# Altium footprint library Printing.PcbLib: 48 footprints (part 2 of 3)
Each footprint in its own frame and in the unit in brackets; x right, y up, seen from the top. Pads: shape width x height; smd on the part's side, far side on the other; paste and mask are expansions set on the pad; w line width, h text height; cw(c..) or ccw(c..) is an arc to the next point about the centre after c.
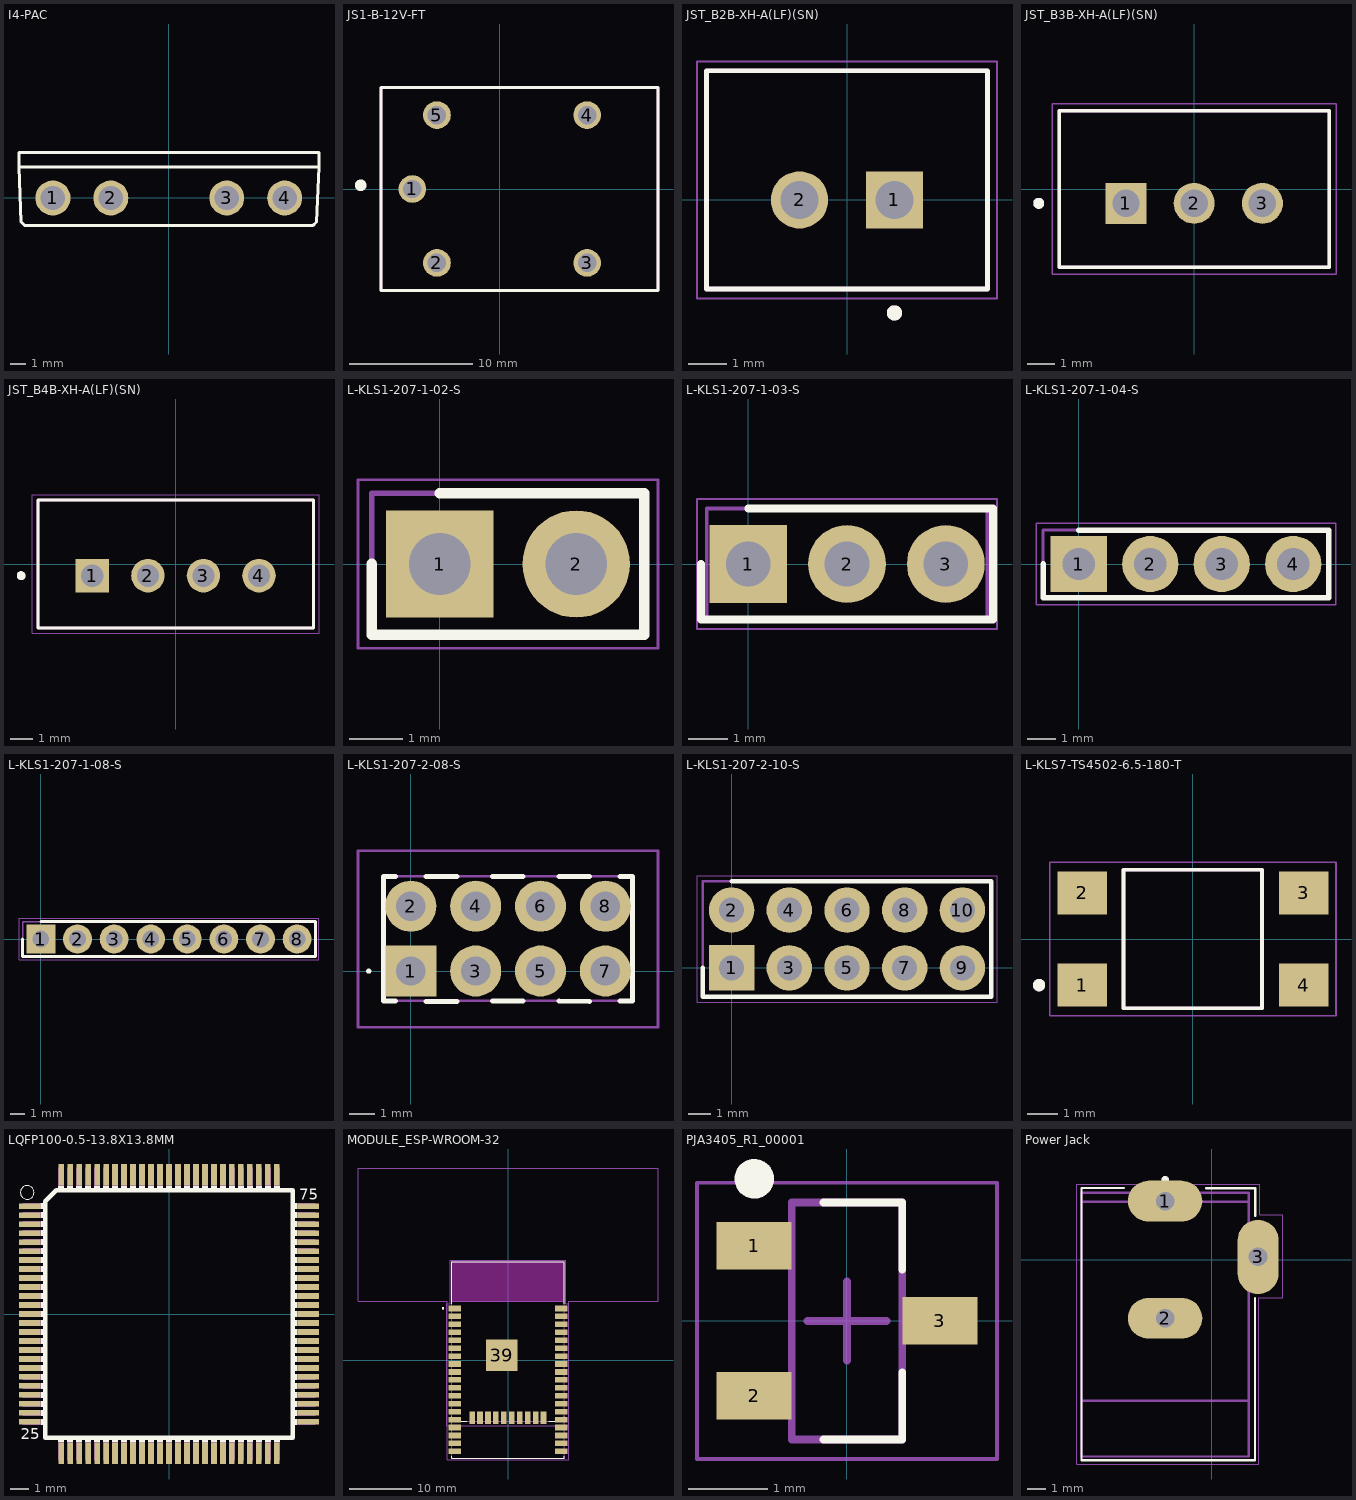
[diagram p1: the footprints below, top view; thin cyan lines are the x and y axes]

## I4-PAC [mm]
pads (4):
  round 2.3 hole 1.6: 1(-7.62,0) 2(-3.81,0) 3(3.81,0) 4(7.62,0)
Top Overlay:
  lines w0.203: -9.85,2.025 -9.71,-1.58 -9.456,-1.825 9.457,-1.825 9.711,-1.583 9.875,2.025 ; -9.85,2.025 -9.85,3 9.875,3 9.875,2.025 ; -9.85,2.025 9.875,2.025

## JS1-B-12V-FT [mm]
pads (5):
  round 2.25 hole 1.5: 1(-7.1,0) 2(-5.1,-6) 3(7.1,-6) 4(7.1,6) 5(-5.1,6)
Top Overlay:
  circle w0.5: c-11.293,0.301 r0.219
  lines w0.254: -9.65,-8.25 -9.65,8.25 12.85,8.25 12.85,-8.25 -9.65,-8.25
Mechanical 13:
  lines w0.254: -9.65,-8.25 12.85,-8.25 12.85,8.25 -9.65,8.25 -9.65,-8.25
3D body "G5LE-1-DC5.stp": height 18.5, standoff -4, extent -9.65,-8.25 12.85,8.25

## JST_B2B-XH-A(LF)(SN) [mm]
pads (2):
  rect 1.508x1.508 hole 1: 1(1.25,0)
  round 1.508 hole 1: 2(-1.25,0)
Top Overlay:
  circle w0.2: c1.25,-2.975 r0.1
  lines w0.127: -3.7,-2.35 -3.7,3.4 3.7,3.4 3.7,-2.35 -3.7,-2.35
Mechanical 13:
  circle w0.2: c1.25,-2.975 r0.1
  lines w0.127: -3.7,-2.35 -3.7,3.4 3.7,3.4 3.7,-2.35 -3.7,-2.35
Mechanical 15:
  lines w0.05: -3.95,-2.6 -3.95,3.65 3.95,3.65 3.95,-2.6 -3.95,-2.6
3D body "step_temp.STEP": height 7, standoff -3.4, extent -3.7,-2.321 3.7,3.429

## JST_B3B-XH-A(LF)(SN) [mm]
pads (3):
  rect 1.508x1.508 hole 1: 1(-2.5,-0.525)
  round 1.508 hole 1: 2(0,-0.525) 3(2.5,-0.525)
Top Overlay:
  circle w0.2: c-5.7,-0.525 r0.1
  lines w0.127: -4.95,-2.875 4.95,-2.875 4.95,2.875 -4.95,2.875 -4.95,-2.875
Mechanical 13:
  circle w0.2: c-5.7,-0.525 r0.1
  lines w0.127: -4.95,-2.875 4.95,-2.875 4.95,2.875 -4.95,2.875 -4.95,-2.875
Mechanical 15:
  lines w0.05: -5.2,-3.125 -5.2,3.125 5.2,3.125 5.2,-3.125 -5.2,-3.125
3D body "B3B-XH-A-LF--SN---3DModel-STEP-418109.STEP": height 7, standoff -3.4, extent -4.95,-2.875 4.95,2.875

## JST_B4B-XH-A(LF)(SN) [mm]
pads (4):
  rect 1.508x1.508 hole 1: 1(-3.75,-0.525)
  round 1.508 hole 1: 2(-1.25,-0.525) 3(1.25,-0.525) 4(3.75,-0.525)
Top Overlay:
  circle w0.2: c-6.95,-0.525 r0.1
  lines w0.127: -6.2,-2.875 -6.2,2.875 6.2,2.875 6.2,-2.875 -6.2,-2.875
Mechanical 13:
  circle w0.2: c-6.95,-0.525 r0.1
  lines w0.127: -6.2,-2.875 -6.2,2.875 6.2,2.875 6.2,-2.875 -6.2,-2.875
Mechanical 15:
  lines w0.05: -6.45,-3.125 6.45,-3.125 6.45,3.125 -6.45,3.125 -6.45,-3.125
3D body "B4B-XH-A-LF--SN---3DModel-STEP-418109.STEP": height 7, standoff -3.4, extent -6.2,-2.875 6.2,2.875

## L-KLS1-207-1-02-S [mm]
pads (2):
  rect 2x2 hole 1.15: 1(0,0)
  round 2 hole 1.15: 2(2.54,0)
Top Overlay:
  lines w0.2: -1.27,0 -1.27,-1.32 3.81,-1.32 3.81,1.32 0,1.32
Mechanical 13:
  lines w0.1: -1.27,-1.32 3.81,-1.32 3.81,1.32 -1.27,1.32 -1.27,-1.32
Mechanical 15:
  lines w0.05: -1.524,-1.57 4.064,-1.57 4.064,1.57 -1.524,1.57 -1.524,-1.57
3D body "M20-9990246.stp": height 8.74, standoff -3, extent -1.27,-1.27 3.81,1.27

## L-KLS1-207-1-03-S [mm]
pads (3):
  rect 2x2 hole 1.15: 1(0,0)
  round 2 hole 1.15: 2(2.54,0) 3(5.08,0)
Top Overlay:
  lines w0.2: -1.212,0 -1.212,-1.425 6.293,-1.425 6.293,1.425 0,1.425
Mechanical 13:
  lines w0.1: -1.065,-1.425 -1.065,1.425 6.145,1.425 6.145,-1.425 -1.065,-1.425
Mechanical 15:
  lines w0.05: -1.315,-1.675 -1.315,1.675 6.395,1.675 6.395,-1.675 -1.315,-1.675
3D body "5-146281-3.stp": height 8.12, standoff -3.05, extent -1.067,-1.168 6.147,1.168

## L-KLS1-207-1-04-S [mm]
pads (4):
  rect 2x2 hole 1.15: 1(0,0)
  round 2 hole 1.15: 2(2.54,0) 3(5.08,0) 4(7.62,0)
Top Overlay:
  lines w0.2: -1.27,0 -1.27,-1.205 8.89,-1.205 8.89,1.205 0,1.205
Mechanical 13:
  lines w0.1: -1.27,-1.205 -1.27,1.205 8.89,1.205 8.89,-1.205 -1.27,-1.205
Mechanical 15:
  lines w0.05: -1.524,-1.455 -1.524,1.455 9.144,1.455 9.144,-1.455 -1.524,-1.455
3D body "68001-204HLF.stp": height 8.18, standoff -3.25, extent -1.27,-1.206 8.89,1.206

## L-KLS1-207-1-08-S [mm]
pads (8):
  rect 2x2 hole 1.15: 1(0,0)
  round 2 hole 1.15: 2(2.54,0) 3(5.08,0) 4(7.62,0) 5(10.16,0) 6(12.7,0) 7(15.24,0) 8(17.78,0)
Top Overlay:
  lines w0.2: -1.27,0 -1.27,-1.205 19.05,-1.205 19.05,1.205 0,1.205
Mechanical 13:
  lines w0.1: -1.27,-1.205 -1.27,1.205 19.05,1.205 19.05,-1.205 -1.27,-1.205
Mechanical 15:
  lines w0.05: -1.52,-1.455 -1.52,1.455 19.3,1.455 19.3,-1.455 -1.52,-1.455
3D body "68001-208HLF.stp": height 8.38, standoff -3.05, extent -1.27,-1.206 19.05,1.206

## L-KLS1-207-2-08-S [mm]
pads (8):
  rect 2x2 hole 1.15: 1(0,0)
  round 2 hole 1.15: 2(0,2.54) 3(2.54,0) 4(2.54,2.54) 5(5.08,0) 6(5.08,2.54) 7(7.62,0) 8(7.62,2.54)
Top Overlay:
  lines w0.1: -1.7,0 cw(c-1.65,0) -1.6,0 cw(c-1.65,0) -1.7,0
  lines w0.2: -0.6,-1.17 -1.07,-1.17 -1.07,3.71 -0.6,3.71 ; 0.6,-1.2 1.8,-1.2 ; 0.6,3.71 1.8,3.71 ; 3.2,-1.17 4.4,-1.17 ; 3.2,3.71 4.4,3.71 ; 5.8,-1.17 7,-1.2 ; 5.8,3.71 7,3.71 ; 8.2,-1.17 8.68,-1.17 8.68,3.71 8.2,3.71
Mechanical 13:
  lines w0.1: -1.07,-1.17 8.68,-1.17 8.68,3.71 -1.07,3.71 -1.07,-1.17
Mechanical 15:
  lines w0.1: -2.07,-2.2 9.68,-2.2 9.68,4.71 -2.07,4.71 -2.07,-2.2
3D body "5-146254-4.stp": height 8.2, standoff -2.97, extent -1.067,-1.178 8.687,3.698

## L-KLS1-207-2-10-S [mm]
pads (10):
  rect 2x2 hole 1.1: 1(0,0)
  round 2 hole 1.1: 2(0,2.54) 3(2.54,0) 4(2.54,2.54) 5(5.08,0) 6(5.08,2.54) 7(7.62,0) 8(7.62,2.54) 9(10.16,0) 10(10.16,2.54)
Top Overlay:
  lines w0.2: -1.27,0 -1.27,-1.27 11.43,-1.27 11.43,3.81 0,3.81
Mechanical 13:
  lines w0.1: -1.27,-1.27 11.43,-1.27 11.43,3.81 -1.27,3.81 -1.27,-1.27
Mechanical 15:
  lines w0.05: -1.52,-1.52 11.68,-1.52 11.68,4.06 -1.52,4.06 -1.52,-1.52
3D body "90131-0765.stp": height 9.25, standoff -2.9, extent -1.27,-1.27 11.43,3.81

## L-KLS7-TS4502-6.5-180-T [mm]
pads (4):
  rect 1.6x1.4 smd: 1(-3.6,-1.5) 2(-3.6,1.5) 3(3.6,1.5) 4(3.6,-1.5)
Top Overlay:
  circle w0.2: c-5,-1.5 r0.1
  lines w0.127: -2.25,-2.25 -2.25,2.25 2.25,2.25 2.25,-2.25 -2.25,-2.25
Mechanical 13:
  circle w0.2: c-5,-1.5 r0.1
  lines w0.127: -2.25,-2.25 -2.25,2.25 2.25,2.25 2.25,-2.25 -2.25,-2.25
Mechanical 15:
  lines w0.05: -4.65,-2.5 -4.65,2.5 4.65,2.5 4.65,-2.5 -4.65,-2.5
3D body "step_temp.STEP": height 3.7, standoff -0.1, extent -3.75,-2.25 3.75,2.25

## LQFP100-0.5-13.8X13.8MM [mm]
pads (100):
  rect 1.2x0.32 smd: 1(-7.75,6) 2(-7.75,5.5) 3(-7.75,5) 4(-7.75,4.5) 5(-7.75,4) 6(-7.75,3.5) 7(-7.75,3) 8(-7.75,2.5) 9(-7.75,2) 10(-7.75,1.5) 11(-7.75,1) 12(-7.75,0.5) 13(-7.75,0) 14(-7.75,-0.5) 15(-7.75,-1) 16(-7.75,-1.5) 17(-7.75,-2) 18(-7.75,-2.5) 19(-7.75,-3) 20(-7.75,-3.5) 21(-7.75,-4) 22(-7.75,-4.5) 23(-7.75,-5) 24(-7.75,-5.5) 25(-7.75,-6) 51(7.75,-6) 52(7.75,-5.5) 53(7.75,-5) 54(7.75,-4.5) 55(7.75,-4) 56(7.75,-3.5) 57(7.75,-3) 58(7.75,-2.5) 59(7.75,-2) 60(7.75,-1.5) 61(7.75,-1) 62(7.75,-0.5) 63(7.75,0) 64(7.75,0.5) 65(7.75,1) 66(7.75,1.5) 67(7.75,2) 68(7.75,2.5) 69(7.75,3) 70(7.75,3.5) 71(7.75,4) 72(7.75,4.5) 73(7.75,5) 74(7.75,5.5) 75(7.75,6)
  rect 0.32x1.2 smd: 26(-6,-7.75) 27(-5.5,-7.75) 28(-5,-7.75) 29(-4.5,-7.75) 30(-4,-7.75) 31(-3.5,-7.75) 32(-3,-7.75) 33(-2.5,-7.75) 34(-2,-7.75) 35(-1.5,-7.75) 36(-1,-7.75) 37(-0.5,-7.75) 38(0,-7.75) 39(0.5,-7.75) 40(1,-7.75) 41(1.5,-7.75) 42(2,-7.75) 43(2.5,-7.75) 44(3,-7.75) 45(3.5,-7.75) 46(4,-7.75) 47(4.5,-7.75) 48(5,-7.75) 49(5.5,-7.75) 50(6,-7.75) 76(6,7.75) 77(5.5,7.75) 78(5,7.75) 79(4.5,7.75) 80(4,7.75) 81(3.5,7.75) 82(3,7.75) 83(2.5,7.75) 84(2,7.75) 85(1.5,7.75) 86(1,7.75) 87(0.5,7.75) 88(0,7.75) 89(-0.5,7.75) 90(-1,7.75) 91(-1.5,7.75) 92(-2,7.75) 93(-2.5,7.75) 94(-3,7.75) 95(-3.5,7.75) 96(-4,7.75) 97(-4.5,7.75) 98(-5,7.75) 99(-5.5,7.75) 100(-6,7.75)
Top Overlay:
  drawing of 106 lines, arcs and shapes, not listed
  text "75" at 7.239,6.35 h0.61
  text "25" at -8.255,-6.985 h0.61
Mechanical 13:
  drawing of 100 lines, arcs and shapes, not listed
3D body "STM32F407VET6.STEP": height 1.6, standoff 0, extent -8,-8 8,8

## MODULE_ESP-WROOM-32 [mm]
pads (49):
  rect 2x0.9 smd: 1(-8.5,8.26) 2(-8.5,6.99) 3(-8.5,5.72) 4(-8.5,4.45) 5(-8.5,3.18) 6(-8.5,1.91) 7(-8.5,0.64) 8(-8.5,-0.63) 9(-8.5,-1.9) 10(-8.5,-3.17) 11(-8.5,-4.44) 12(-8.5,-5.71) 13(-8.5,-6.98) 14(-8.5,-8.25) 15(-8.5,-9.52) 16(-8.5,-10.79) 17(-8.5,-12.06) 18(-8.5,-13.33) 19(-8.5,-14.6) 20(8.5,-14.6) 21(8.5,-13.33) 22(8.5,-12.06) 23(8.5,-10.79) 24(8.5,-9.52) 25(8.5,-8.25) 26(8.5,-6.98) 27(8.5,-5.71) 28(8.5,-4.44) 29(8.5,-3.17) 30(8.5,-1.9) 31(8.5,-0.63) 32(8.5,0.64) 33(8.5,1.91) 34(8.5,3.18) 35(8.5,4.45) 36(8.5,5.72) 37(8.5,6.99) 38(8.5,8.26)
  rect 0.9x2 smd: 15(-5.74,-9.253) 16(-4.47,-9.253) 17(-3.2,-9.253) 18(-1.93,-9.253) 19(-0.66,-9.253) 20(0.61,-9.253) 21(1.88,-9.253) 22(3.15,-9.253) 23(4.42,-9.253) 24(5.69,-9.253)
  rect 5x5 smd paste-0.92: 39(-1,0.76)
Top Overlay:
  circle w0.2: c-10.4,8.3 r0.1
  lines w0.127: -9.025,-9.103 -9.025,-9.753 -6.575,-9.753 ; -9.025,9.247 -9.025,15.747 8.975,15.747 8.975,9.247 ; -9,-15.36 -9,-15.7 9,-15.7 9,-15.36 ; -9,9.03 -9,15.7 9,15.7 9,9.03 ; 6.525,-9.753 8.975,-9.753 8.975,-9.103
Keep-Out Layer:
  region: 8.975,9.447 -9.025,9.447 -9.025,15.747 8.975,15.747
Mechanical 13:
  circle w0.2: c-10.4,8.3 r0.1
  lines w0.127: -9.025,9.447 8.975,9.447 ; -9.025,9.447 -9.025,15.747 8.975,15.747 8.975,9.447 ; -9.025,9.447 -9.025,-9.753 8.975,-9.753 8.975,9.447 ; -9,9.4 -9,-15.7 9,-15.7 9,9.4 ; -9,9.4 -9,15.7 9,15.7 9,9.4 ; -9,9.4 9,9.4
  text "ANTENNA" at -3.7,11.9 h1.27
Mechanical 15:
  lines w0.05: -24,9.4 -9.75,9.4 -9.75,-15.95 9.75,-15.95 9.75,9.4 24,9.4 24,30.7 -24,30.7 -24,9.4 ; -9.775,-10.503 -9.775,8.997 -9.275,8.997 -9.275,15.997 9.225,15.997 9.225,8.997 9.725,8.997 9.725,-10.503 -9.775,-10.503
3D body "step_temp.STEP": height 3.2, standoff 0, extent -9.025,-9.753 8.975,15.747

## PJA3405_R1_00001 [mm]
pads (3):
  rect 0.95x0.6 smd: 1(-1.175,0.95) 2(-1.175,-0.95) 3(1.175,0)
Top Overlay:
  circle w0.25: c-1.175,1.8 r0.125
  lines w0.1: -0.3,-1.5 0.7,-1.5 0.7,-0.65 ; -0.3,1.5 0.7,1.5 0.7,0.65
Mechanical 13:
  lines w0.1: -0.7,-1.5 0.7,-1.5 0.7,1.5 -0.7,1.5 -0.7,-1.5
Mechanical 15:
  lines w0.05: -1.9,-1.75 1.9,-1.75 1.9,1.75 -1.9,1.75 -1.9,-1.75
  lines w0.1: -0.5,0 0.5,0 ; 0,-0.5 0,0.5
3D body "SOT23 (TO-236AB).step": height 1.1, standoff 0, extent -1.35,-1.5 1.35,1.5

## Power Jack [mm]
pads (3):
  oval 4x2.2 hole 1 square: 1(-2.5,3.15) 2(-2.5,-3.15)
  oval 2.2x4 hole 1 square: 3(2.5,0.15)
Top Overlay:
  circle w0.2: c-2.5,4.3 r0.1
  lines w0.127: -4.72,3.86 -7,3.86 -7,-10.78 2.34,-10.78 2.34,-2.07 ; -0.28,3.85 2.35,3.85 2.35,2.37
Mechanical 13:
  circle w0.2: c-2.5,4.3 r0.1
  lines w0.127: -7,-7.59 2,-7.59 ; -7,-7.59 -7,-10.59 2,-10.59 2,-7.59 ; -7,-7.59 -7,3.11 ; -7,3.11 2,3.11 ; -7,3.11 -7,3.6 2,3.6 2,3.11 ; 2,-7.59 2,3.11
Mechanical 15:
  lines w0.05: -7.25,-10.99 2.55,-10.99 2.55,-2.05 3.84,-2.05 3.84,2.42 2.6,2.42 2.6,4.05 -7.25,4.05 -7.25,-10.99
3D body "EJ503B--3DModel-STEP-231308.STEP": height 11.3, standoff -4, extent -7.04,-10.79 2.34,3.83